# Altium footprint library vestibular_vampire.PcbLib: 82 footprints (part 3 of 6)
Each footprint in its own frame and in the unit in brackets; x right, y up, seen from the top. Pads: shape width x height; smd on the part's side, far side on the other; paste and mask are expansions set on the pad; w line width, h text height; cw(c..) or ccw(c..) is an arc to the next point about the centre after c.
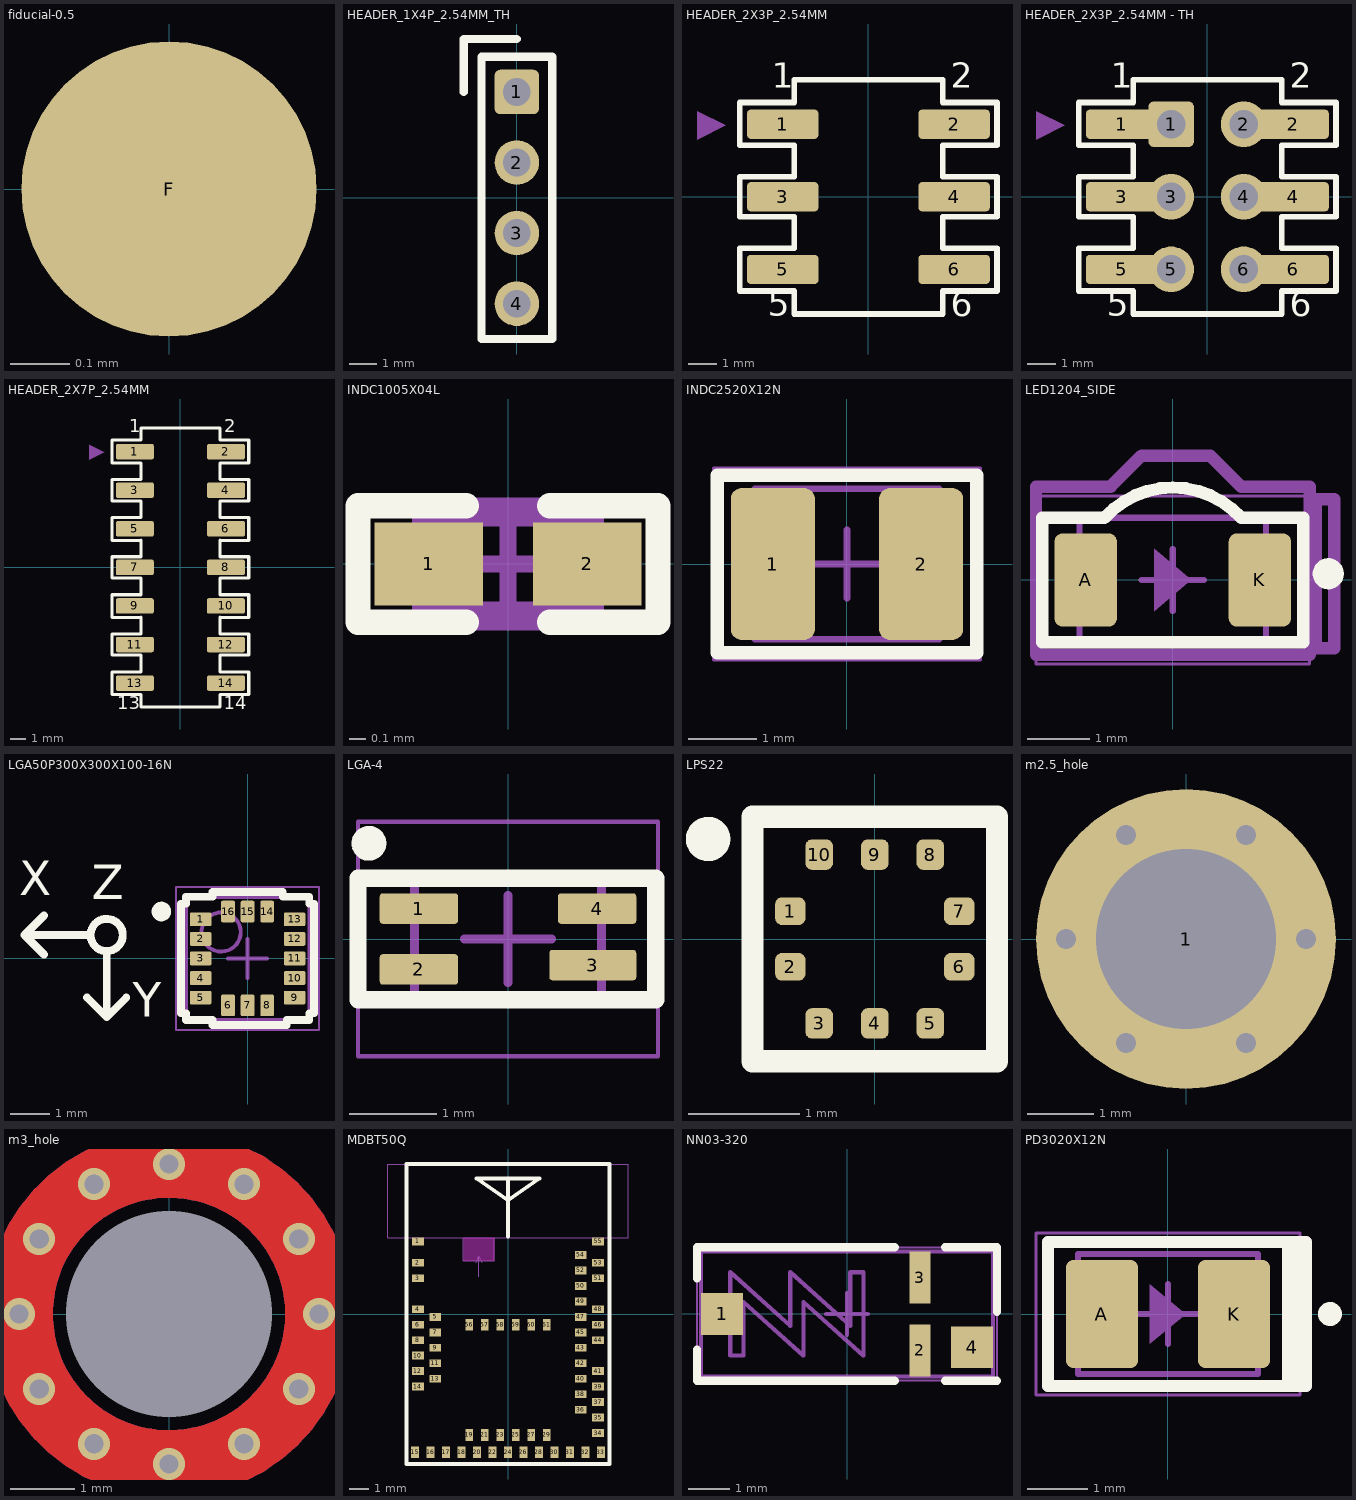
[diagram p2: the footprints below, top view; thin cyan lines are the x and y axes]

## fiducial-0.5 [mm]
pads (1):
  round 0.5 smd paste-0.25 mask+0.5: F(0,0)

## HEADER_1X4P_2.54MM_TH [mm]
pads (4):
  rrect25% 1.6x1.6 hole 1: 1(0,3.81)
  round 1.6 hole 1: 2(0,1.27) 3(0,-1.27) 4(0,-3.81)
Top Overlay:
  lines w0.3: -1.905,3.81 -1.905,5.715 0,5.715 ; -1.27,-5.08 1.27,-5.08 1.27,5.08 -1.27,5.08 -1.27,-5.08

## HEADER_2X3P_2.54MM [mm]
pads (6):
  rrect25% 2.5x1.02 smd: 1(-3,2.54) 2(3,2.54) 3(-3,0) 4(3,0) 5(-3,-2.54) 6(3,-2.54)
Top Overlay:
  lines w0.2: -4.5,-3.3 -2.6,-3.3 -2.6,-4.1 2.6,-4.1 2.6,-3.3 4.5,-3.3 4.5,-1.8 2.6,-1.8 2.6,-0.7 4.5,-0.7 4.5,0.7 2.6,0.7 2.6,1.8 4.5,1.8 4.5,3.3 2.6,3.3 2.6,4.1 -2.6,4.1 -2.6,3.3 -4.5,3.3 -4.5,1.8 -2.6,1.8 -2.6,0.7 -4.5,0.7 -4.5,-0.7 -2.6,-0.7 -2.6,-1.8 -4.5,-1.8 -4.5,-3.3
  text "1" at -3.377,3.518 h1.5
  text "2" at 2.882,3.518 h1.5
  text "5" at -3.518,-4.466 h1.5
  text "6" at 2.883,-4.474 h1.5
Mechanical 1:
  region: -5,2.5 -6,2 -6,3
3D body "dw254s-22-06-85.sldprt": height 8.86, standoff 0.01, extent -3.55,-4.064 3.55,4.064

## HEADER_2X3P_2.54MM - TH [mm]
pads (12):
  rrect25% 2.5x1.02 smd: 1(-3,2.54) 2(3,2.54) 3(-3,0) 4(3,0) 5(-3,-2.54) 6(3,-2.54)
  rrect25% 1.6x1.6 / inner rrect25% 1.6x1.6 / far side rrect25% 2x1.6 hole 1: 1(-1.27,2.54)
  round 1.6 / inner round 1.6 / far side oval 2x1.6 hole 1: 2(1.27,2.54) 3(-1.27,0) 4(1.27,0) 5(-1.27,-2.54) 6(1.27,-2.54)
Top Overlay:
  lines w0.2: -4.5,-3.3 -2.6,-3.3 -2.6,-4.1 2.6,-4.1 2.6,-3.3 4.5,-3.3 4.5,-1.8 2.6,-1.8 2.6,-0.7 4.5,-0.7 4.5,0.7 2.6,0.7 2.6,1.8 4.5,1.8 4.5,3.3 2.6,3.3 2.6,4.1 -2.6,4.1 -2.6,3.3 -4.5,3.3 -4.5,1.8 -2.6,1.8 -2.6,0.7 -4.5,0.7 -4.5,-0.7 -2.6,-0.7 -2.6,-1.8 -4.5,-1.8 -4.5,-3.3
  text "1" at -3.377,3.518 h1.5
  text "2" at 2.882,3.518 h1.5
  text "5" at -3.518,-4.466 h1.5
  text "6" at 2.883,-4.474 h1.5
Mechanical 1:
  region: -5,2.5 -6,2 -6,3
3D body "dw254s-22-06-85.sldprt": height 8.86, standoff 0.01, extent -3.55,-4.064 3.55,4.064

## HEADER_2X7P_2.54MM [mm]
pads (14):
  rrect25% 2.5x1.02 smd: 1(-3,7.62) 2(3,7.62) 3(-3,5.08) 4(3,5.08) 5(-3,2.54) 6(3,2.54) 7(-3,0) 8(3,0) 9(-3,-2.54) 10(3,-2.54) 11(-3,-5.08) 12(3,-5.08) 13(-3,-7.62) 14(3,-7.62)
Top Overlay:
  lines w0.2: -2.6,-3.3 -4.5,-3.3 -4.5,-1.8 -2.6,-1.8 -2.6,-0.7 -4.5,-0.7 -4.5,0.7 -2.6,0.7 -2.6,1.8 ; -2.6,-3.28 -2.6,-4.38 -4.5,-4.38 -4.5,-5.78 -2.6,-5.78 -2.6,-6.88 -4.5,-6.88 -4.5,-8.38 -2.6,-8.38 -2.6,-9.18 2.6,-9.18 2.6,-8.38 4.5,-8.38 4.5,-6.88 2.6,-6.88 2.6,-5.78 4.5,-5.78 4.5,-4.38 2.6,-4.38 2.6,-3.28 ; -2.6,1.78 -4.5,1.78 -4.5,3.28 -2.6,3.28 -2.6,4.38 -4.5,4.38 -4.5,5.78 -2.6,5.78 -2.6,6.88 -4.5,6.88 -4.5,8.38 -2.6,8.38 -2.6,9.18 2.6,9.18 2.6,8.38 4.5,8.38 4.5,6.88 2.6,6.88 2.6,5.78 4.5,5.78 4.5,4.38 2.6,4.38 2.6,3.28 4.5,3.28 4.5,1.78 2.6,1.78 ; 2.6,-3.3 4.5,-3.3 4.5,-1.8 2.6,-1.8 2.6,-0.7 4.5,-0.7 4.5,0.7 2.6,0.7 2.6,1.8
  text "13" at -4.142,-9.643 h1.5
  text "14" at 2.86,-9.652 h1.5
  text "1" at -3.377,8.598 h1.5
  text "2" at 2.882,8.598 h1.5
Mechanical 1:
  region: -5,7.58 -6,7.08 -6,8.08

## INDC1005X04L [mm]
pads (2):
  rect 0.65x0.5 smd: 1(-0.475,0) 2(0.475,0)
Top Overlay:
  lines w0.152: -0.25,-0.35 -0.9,-0.35 -0.9,0.35 -0.25,0.35 ; 0.25,-0.35 0.9,-0.35 0.9,0.35 0.25,0.35
Bottom Courtyard:
  lines w0.1: -0.525,-0.275 -0.525,0.275 0.525,0.275 0.525,-0.275 -0.525,-0.275
  text ".Designator" at -0.254,-0.152 h0.3
Mechanical 15:
  lines w0.1: -0.275,0 0.275,0 ; 0,-0.275 0,0.275 ; -0.9,-0.35 -0.9,0.35 0.9,0.35 0.9,-0.35 -0.9,-0.35
3D body "User Library-Chip Inductor 0402.step": height 0.5, standoff 0, extent -0.5,-0.275 0.5,0.325

## INDC2520X12N [mm] "Chip Inductor, 2-Leads, Body 2.50x2.00mm, IPC Medium Density"
height 1.2
pads (2):
  rrect25% 1.23x2.22 smd: 1(-1.085,0) 2(1.085,0)
Top Overlay:
  lines w0.2: -1.9,-1.3 1.9,-1.3 1.9,1.3 -1.9,1.3 -1.9,-1.3
Mechanical 13:
  lines w0.1: -1.35,-1.1 -1.35,1.1 1.35,1.1 1.35,-1.1 -1.35,-1.1
Mechanical 15:
  lines w0.05: -1.95,-1.4 -1.95,1.4 1.95,1.4 1.95,-1.4 -1.95,-1.4
  lines w0.1: -0.5,0 0.5,0 ; 0,-0.5 0,0.5
3D body "INDC2520X12N.step": height 1.2, standoff 0, extent -1.35,-1.1 1.35,1.1

## LED1204_SIDE [mm]
pads (2):
  rrect25% 1x1.5 smd: A(-1.4,0) K(1.4,0)
Top Overlay:
  circle w0.25: c2.5,0.1 r0.125
  lines w0.2: -2.1,-1 -2.1,1 -1.1,1 cw(c0,0) 1.1,1 2.1,1 2.1,-0.9 2.1,-1 -2.1,-1
Mechanical 1:
  region: 0.3,0 -0.3,-0.5 -0.3,0.5
  lines w0.2: -2.2,-1.2 -2.2,1.5 -1,1.5 -0.5,2 0.6,2 1.1,1.5 2.2,1.5 2.2,-1.2 -2.2,-1.2 ; 2.3,-1.1 2.6,-1.1 2.6,1.3 2.3,1.3 2.3,-1.1
Mechanical 13:
  lines w0.1: -1.5,-1 -1.5,1 1.5,1 1.5,-1 -1.5,-1
Mechanical 15:
  lines w0.05: -2.2,-1.35 -2.2,1.35 2.2,1.35 2.2,-1.35 -2.2,-1.35
  lines w0.1: -0.5,0 0.5,0 ; 0,-0.5 0,0.5
3D body "1204_LED_S.step": height 0.99, standoff 0, extent -1.6,-0.254 1.6,1.237

## LGA50P300X300X100-16N [mm] "LGA, 16-Leads, Body 3.00x3.00mm, Pitch 0.50mm, IPC Medium Density"
height 1
pads (16):
  rrect20% 0.55x0.35 smd: 1(-1.2,1) 2(-1.2,0.5) 3(-1.2,0) 4(-1.2,-0.5) 5(-1.2,-1) 9(1.2,-1) 10(1.2,-0.5) 11(1.2,0) 12(1.2,0.5) 13(1.2,1)
  rrect20% 0.35x0.55 smd: 6(-0.5,-1.2) 7(0,-1.2) 8(0.5,-1.2) 14(0.5,1.2) 15(0,1.2) 16(-0.5,1.2)
Top Overlay:
  circle w0.25: c-2.2,1.2 r0.125
  circle w0.2: c-3.6,0.6 r0.412
  lines w0.2: -5.2,0.1 -5.7,0.6 ; -5.2,1.1 -5.7,0.6 ; -4.1,-1 -3.6,-1.5 ; -4.1,0.6 -5.7,0.6 ; -3.6,0.1 -3.6,-1.5 ; -3.1,-1 -3.6,-1.5 ; -1.7,-1.4 -1.575,-1.4 -1.575,-1.575 -0.9,-1.575 -0.9,-1.7 1,-1.7 1,-1.575 1.575,-1.575 1.575,-1.4 1.7,-1.4 1.7,1.4 1.575,1.4 1.575,1.575 0.9,1.575 0.9,1.7 -0.9,1.7 -0.9,1.575 -1.575,1.575 -1.575,1.4 -1.7,1.4 -1.7,-1.4
  text "Y" at -2.939,-1.78 h1.5
  text "X" at -5.84,1.32 h1.5
  text "Z" at -3.979,1.22 h1.5
Mechanical 13:
  circle w0.1: c-0.675,0.675 r0.5
  lines w0.1: -1.575,-1.575 1.575,-1.575 1.575,1.575 -1.575,1.575 -1.575,-1.575
Mechanical 15:
  lines w0.05: -1.825,-1.825 1.825,-1.825 1.825,1.825 -1.825,1.825 -1.825,-1.825
  lines w0.1: -0.5,0 0.5,0 ; 0,-0.5 0,0.5
3D body "LGA50P300X300X100-16N.step": height 1, standoff 0, extent -1.575,-1.575 1.575,1.575

## LGA-4 [mm] "VEML6040A3OG Color Sensor"
height 1.1
pads (4):
  rrect20% 0.9x0.35 smd: 1(-1.025,0.35) 2(-1.025,-0.35) 4(1.025,0.35)
  rrect20% 1x0.35 smd: 3(0.975,-0.3)
Top Overlay:
  circle w0.2: c-1.6,1.1 r0.1
  lines w0.2: -1.725,-0.7 -1.725,0.7 1.7,0.7 1.7,-0.7 -1.725,-0.7
Mechanical 13:
  lines w0.1: -1.075,-0.7 1.075,-0.7 1.075,0.7 -1.075,0.7 -1.075,-0.7
Mechanical 15:
  lines w0.05: -1.725,-1.35 1.725,-1.35 1.725,1.35 -1.725,1.35 -1.725,-1.35
  lines w0.1: -0.5,0 0.5,0 ; 0,-0.5 0,0.5
3D body "VEML6040.stp": height 1, standoff 0, extent -1,-0.625 1,0.625

## LPS22 [mm] "LGA-10"
pads (10):
  rrect50% 0.275x0.25 smd: 1(-0.76,0.25) 2(-0.76,-0.25) 6(0.76,-0.25) 7(0.76,0.25)
  rrect50% 0.25x0.275 smd: 3(-0.5,-0.76) 4(0,-0.76) 5(0.5,-0.76) 8(0.5,0.76) 9(0,0.76) 10(-0.5,0.76)
Top Overlay:
  circle w0.2: c-1.5,0.9 r0.1
  lines w0.2: -1.1,-1.1 1.1,-1.1 1.1,1.1 -1.1,1.1 -1.1,-1.1
3D body "lps22hh_barometer.step": height 0.81, standoff 0.01, extent -1,-1 1,1

## m2.5_hole [mm] "M2.5 hole, with via stitching"
pads (1):
  round 4.5 hole 2.7 unplated mask+1.25: 1(0,0)
via -0.9,-1.559 diameter 0.5 hole 0.3
via 0.9,-1.559 diameter 0.5 hole 0.3
via 1.8,0 diameter 0.5 hole 0.3
via 0.9,1.559 diameter 0.5 hole 0.3
via -0.9,1.559 diameter 0.5 hole 0.3
via -1.8,0 diameter 0.5 hole 0.3

## m3_hole [mm] "M3 hole, with via stitching"
pads (2):
  round 0.1 smd: 1(0,-2.2)
  round 0 hole 3.2 unplated mask+1.25: 1(0,0)
via 0,2.33 diameter 0.5 hole 0.3
via 0,-2.33 diameter 0.5 hole 0.3
via 2.018,1.165 diameter 0.5 hole 0.3
via -2.018,-1.165 diameter 0.5 hole 0.3
via -2.018,1.165 diameter 0.5 hole 0.3
via 2.018,-1.165 diameter 0.5 hole 0.3
via 1.165,2.018 diameter 0.5 hole 0.3
via -1.165,-2.018 diameter 0.5 hole 0.3
via 2.33,0 diameter 0.5 hole 0.3
via -2.33,0 diameter 0.5 hole 0.3
via -1.165,2.018 diameter 0.5 hole 0.3
via 1.165,-2.018 diameter 0.5 hole 0.3
Top Layer:
  circle w1.05: c0,0 r2.33
Bottom Layer:
  circle w1.05: c0,0 r2.33
Multi-Layer:
  pour cut-out: 0,-1.8 0.177,-1.8 0.526,-1.731 0.854,-1.596 1.149,-1.399 1.4,-1.148 1.598,-0.853 1.734,-0.525 1.803,-0.177 1.803,0 1.8,0 1.8,0.177 1.731,0.525 1.596,0.852 1.4,1.147 1.149,1.397 0.855,1.595 0.528,1.73 0.18,1.8 0.003,1.8 0,1.8 -0.177,1.8 -0.524,1.73 -0.852,1.595 -1.146,1.397 -1.396,1.147 -1.593,0.852 -1.728,0.525 -1.797,0.177 -1.797,0 -1.8,0 -1.8,-0.177 -1.73,-0.525 -1.594,-0.853 -1.397,-1.148 -1.146,-1.399 -0.85,-1.596 -0.522,-1.731 -0.174,-1.8 0.003,-1.8

## MDBT50Q [mm]
pads (61):
  rect 0.6x0.4 smd mask+0.05: 1(-4.65,3.75) 2(-4.65,2.65) 3(-4.65,1.85) 4(-4.65,0.25) 5(-3.75,-0.15) 6(-4.65,-0.55) 7(-3.75,-0.95) 8(-4.65,-1.35) 9(-3.75,-1.75) 10(-4.65,-2.15) 11(-3.75,-2.55) 12(-4.65,-2.95) 13(-3.75,-3.35) 14(-4.65,-3.75) 34(4.65,-6.15) 35(4.65,-5.35) 36(3.75,-4.95) 37(4.65,-4.55) 38(3.75,-4.15) 39(4.65,-3.75) 40(3.75,-3.35) 41(4.65,-2.95) 42(3.75,-2.55) 43(3.75,-1.75) 44(4.65,-1.35) 45(3.75,-0.95) 46(4.65,-0.55) 47(3.75,-0.15) 48(4.65,0.25) 49(3.75,0.65) 50(3.75,1.45) 51(4.65,1.85) 52(3.75,2.25) 53(4.65,2.65) 54(3.75,3.05) 55(4.65,3.75)
  rect 0.4x0.6 smd mask+0.05: 15(-4.8,-7.15) 16(-4,-7.15) 17(-3.2,-7.15) 18(-2.4,-7.15) 19(-2,-6.25) 20(-1.6,-7.15) 21(-1.2,-6.25) 22(-0.8,-7.15) 23(-0.4,-6.25) 24(0,-7.15) 25(0.4,-6.25) 26(0.8,-7.15) 27(1.2,-6.25) 28(1.6,-7.15) 29(2,-6.25) 30(2.4,-7.15) 31(3.2,-7.15) 32(4,-7.15) 33(4.8,-7.15) 56(-2,-0.55) 57(-1.2,-0.55) 58(-0.4,-0.55) 59(0.4,-0.55) 60(1.2,-0.55) 61(2,-0.55)
Top Layer keep-out:
  rectangle: -2.3,2.75 -0.7,3.95
Top Overlay:
  lines w0.2: 0,4 0,7 ; 0,7 -1.625,7 0,5.875 1.625,7 0,7 ; -5.25,-7.75 -5.25,7.75 5.25,7.75 5.25,-7.75 -5.25,-7.75
Bottom Courtyard:
  lines w0.05: -1.65,2.652 -1.5,2.952 ; -1.5,1.927 -1.5,2.952 ; -1.35,2.652 -1.5,2.952 ; -6.2,3.95 -6.2,7.75 6.2,7.75 6.2,3.95 -6.2,3.95 ; -2.3,2.75 -2.3,3.95 -0.7,3.95 -0.7,2.75 -2.3,2.75
  text "No ground pad" at -2.801,5.975 h0.45
  text "Toplayer no ground pad" at -3.4,1.525 h0.3
3D body "mdbt50q.sldprt": height 2.05, standoff 0, extent -5.25,-7.75 5.25,7.75

## NN03-320 [mm]
pads (4):
  rect 1x1 smd: 1(-3,0) 4(3,-0.8)
  rect 0.5x1.25 smd: 2(1.75,-0.875) 3(1.75,0.875)
Top Overlay:
  lines w0.2: -3.6,-0.852 -3.6,-1.6 1.148,-1.6 ; -3.6,0.852 -3.6,1.6 1.148,1.6 ; 2.352,-1.6 3.6,-1.6 ; 2.352,1.6 3.6,1.6 3.6,0.052
Bottom Courtyard:
  circle w0.1: c3,-0.75 r0.25
  lines w0.1: -3.5,-1.5 3.5,-1.5 3.5,1.5 -3.5,1.5 -3.5,-1.5 ; -2.8,-1 -2.8,1 -1.36,-0.285 -1.36,1 0.08,-0.285 0.08,1 0.4,1 0.4,-1 -1.04,0.285 -1.04,-1 -2.48,0.285 -2.48,-1 -2.8,-1
  text ".Designator" at 0.828,1.55 h0.31
Mechanical 15:
  lines w0.05: -3.6,-1.6 3.6,-1.6 3.6,1.6 -3.6,1.6 -3.6,-1.6
  lines w0.1: -0.5,0 0.5,0 ; 0,-0.5 0,0.5
Multi-Layer:
  pour cut-out: -3.5,1.5 3.5,1.5 3.5,-1.5 -3.5,-1.5
3D body "NN03-320.stp": height 2.01, standoff -0.01, extent -3.5,-1.5 3.5,1.5

## PD3020X12N [mm] "Photodiode, 2-Leads, Body 3.00x2.00mm, IPC Medium Density"
height 1.2
pads (2):
  rrect20% 1.2x1.8 smd: A(-1.1,0) K(1.1,0)
Top Overlay:
  circle w0.2: c2.7,0 r0.1
  rectangle: 2,-1.2 2.3,1.2
  lines w0.2: 2,-1.2 2,1.2 ; 2,-1.2 -2,-1.2 -2,1.2 2,1.2 ; 2,-1.2 2.3,-1.2 2.3,1.2 2,1.2
Mechanical 1:
  region: 0.3,0 -0.3,-0.5 -0.3,0.5
  lines w0.2: 2,-1.2 2.3,-1.2 2.3,1.2 2,1.2 ; 2,-1.2 2,1.2 ; 2,-1.2 2,1.2 ; 2,-1.2 -2,-1.2 -2,1.2 2,1.2
Mechanical 13:
  lines w0.1: -1.5,-1 1.5,-1 1.5,1 -1.5,1 -1.5,-1
Mechanical 15:
  lines w0.05: -2.2,-1.35 2.2,-1.35 2.2,1.35 -2.2,1.35 -2.2,-1.35
  lines w0.1: -0.5,0 0.5,0 ; 0,-0.5 0,0.5
3D body "zspd-z3020b-29c-z5.sldprt": height 2.9, standoff 0, extent -1.5,-1 1.5,1